# Altium footprint library Capacitor.PcbLib: 59 footprints (part 3 of 4)
Each footprint in its own frame and in the unit in brackets; x right, y up, seen from the top. Pads: shape width x height; smd on the part's side, far side on the other; paste and mask are expansions set on the pad; w line width, h text height; cw(c..) or ccw(c..) is an arc to the next point about the centre after c.
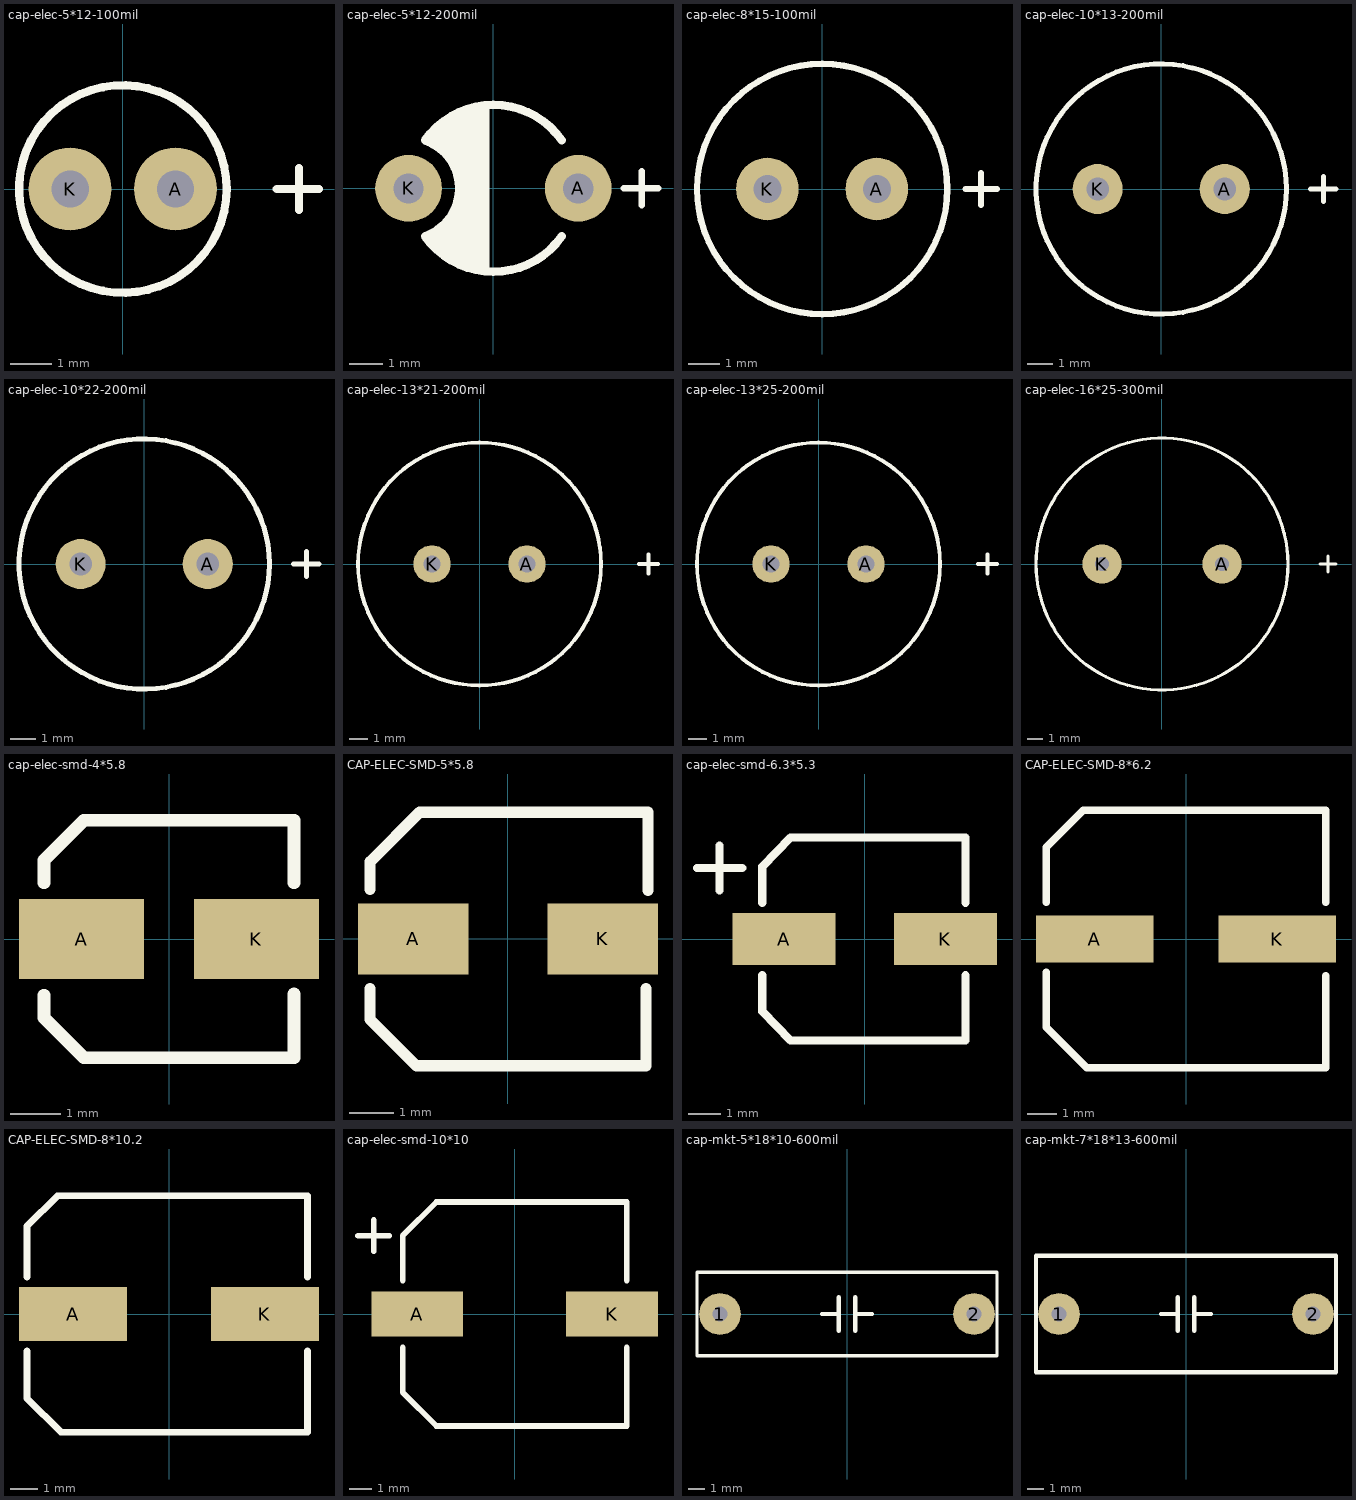
[diagram p2: the footprints below, top view; thin cyan lines are the x and y axes]

## cap-elec-5*12-100mil [mm] "Radial Electrolytic Capacitor - Dimenssion 5*12 (D,H) - 100mil Pitch"
height 12
pads (2):
  round 2 hole 0.9: A(1.27,0) K(-1.27,0)
Top Overlay:
  circle w0.2: c0,0 r2.5
  lines w0.2: 3.708,0 4.724,0 ; 4.242,-0.508 4.242,0.508
3D body "User Library-CE_R100_D200_H460.step": height 13.7, standoff -1.4, extent -2.54,-2.54 2.54,2.54

## cap-elec-5*12-200mil [mm] "Radial Electrolytic Capacitor - Dimenssion 5*12 (D,H) - 200mil Pitch"
height 12
pads (2):
  round 2 hole 0.9: A(2.54,0) K(-2.54,0)
Top Overlay:
  region: -0.127,2.413 -0.127,-2.54 -1.143,-2.286 -2.048,-1.434 -1.27,-0.889 -1.016,0 -1.397,1.016 -2.048,1.434 -1.016,2.286
  lines w0.2: 3.912,0 4.928,0 ; 4.445,-0.508 4.445,0.508
  lines w0.254: 2.048,-1.434 cw(c0,0) -2.048,-1.434 ccw(c-2.54,0) -2.048,1.434 cw(c0,0) 2.048,1.434
3D body "User Library-CE_R200_D200_H460.step": height 14.7, standoff -1.9, extent -2.79,-2.54 2.79,2.54

## cap-elec-8*15-100mil [mm] "Radial Electrolytic Capacitor - Dimenssion 8*15 (D,H) - 100mil Pitch"
height 15
pads (2):
  round 2 hole 0.9: A(1.75,0) K(-1.75,0)
Top Overlay:
  circle w0.2: c0,0 r4
  lines w0.2: 4.588,0 5.588,0 ; 5.08,-0.508 5.08,0.508
3D body "User Library-CE_R150_D320_H570.step": height 14.4, standoff -2.9, extent -4.1,-4.1 4.1,4.1

## cap-elec-10*13-200mil [mm] "Radial Electrolytic Capacitor - Dimenssion 10*13 (D,H) - 200mil Pitch"
height 13
pads (2):
  round 2 hole 0.9: A(2.54,0) K(-2.54,0)
Top Overlay:
  circle w0.2: c0,0 r5
  lines w0.2: 5.969,0 6.985,0 ; 6.477,-0.508 6.477,0.508
3D body "User Library-CE_R200_D400_H500.STEP": height 13.3, standoff -2.1, extent -5.08,-5.08 5.08,5.08

## cap-elec-10*22-200mil [mm] "Radial Electrolytic Capacitor - Dimenssion 10*22 (D,H) - 200mil Pitch"
height 22
pads (2):
  round 2 hole 0.9: A(2.54,0) K(-2.54,0)
Top Overlay:
  circle w0.2: c0,0 r5
  lines w0.2: 5.969,0 6.985,0 ; 6.477,-0.508 6.477,0.508
3D body "User Library-CE_R200_D400_H800.step": height 20.32, standoff -2.9, extent -5.08,-5.08 5.08,5.08

## cap-elec-13*21-200mil [mm] "Radial Electrolytic Capacitor - Dimenssion 13*21 (D,H) - 200mil Pitch"
height 21
pads (2):
  round 2 hole 0.9: A(2.54,0) K(-2.54,0)
Top Overlay:
  circle w0.2: c0,0 r6.5
  lines w0.2: 8.532,0 9.548,0 ; 9.04,-0.508 9.04,0.508
3D body "User Library-CapAluRadial_D125H200.STEP": height 22, standoff -3, extent -6.444,-6.48 6.5,6.48

## cap-elec-13*25-200mil [mm] "Radial Electrolytic Capacitor - Dimenssion 13*25 (D,H) - 200mil Pitch"
height 25
pads (2):
  round 2 hole 0.9: A(2.54,0) K(-2.54,0)
Top Overlay:
  circle w0.2: c0,0 r6.5
  lines w0.2: 8.532,0 9.548,0 ; 9.04,-0.508 9.04,0.508
3D body "User Library-Cap-EL(13x25-5).step": height 25, standoff -3.3, extent -6.502,-6.499 6.5,6.499

## cap-elec-16*25-300mil [mm] "Radial Electrolytic Capacitor - Dimenssion 16*25 (D,H) - 300mil Pitch"
height 25
pads (2):
  round 2.5 hole 0.9: A(3.81,0) K(-3.81,0)
Top Overlay:
  circle w0.2: c0,0 r8
  lines w0.2: 10.032,0 11.048,0 ; 10.54,-0.508 10.54,0.508
3D body "User Library-CE_R300_D650_H1000.STEP": height 26.4, standoff -2.5, extent -8.199,-8.281 8.284,8.18

## cap-elec-smd-4*5.8 [mm]
height 5.8
pads (2):
  rect 2.5x1.6 smd: A(-1.75,0) K(1.75,0)
Top Overlay:
  lines w0.254: -2.5,-1.125 -2.5,-1.575 -1.7,-2.375 2.475,-2.375 2.5,-2.375 2.5,-1.1 ; -2.5,1.125 -2.5,1.575 -1.7,2.375 2.5,2.375 2.5,1.125
3D body "User Library-ALU-B.STEP": height 5.4, standoff 0, extent -2.3,-2.15 2.3,2.15

## CAP-ELEC-SMD-5*5.8 [mm]
height 5.8
pads (2):
  rect 2.5x1.6 smd: A(-2.15,0) K(2.15,0)
Top Overlay:
  lines w0.254: -3.125,-1.125 -3.125,-1.825 -2.075,-2.875 3.125,-2.875 3.125,-1.125 ; -3.125,1.125 -3.125,1.75 -2,2.875 0,2.875 3.175,2.875 3.175,1.1
3D body "User Library-ALU-C.STEP": height 5.41, standoff 0, extent -2.95,-2.65 2.95,2.65

## cap-elec-smd-6.3*5.3 [mm]
height 5.3
pads (2):
  rect 3.2x1.6 smd: A(-2.5,0) K(2.5,0)
Top Overlay:
  lines w0.254: -5.2,2.2 -3.8,2.2 ; -4.5,1.5 -4.5,2.9 ; -3.175,-1.125 -3.175,-2.25 -2.3,-3.15 3.125,-3.15 3.125,-1.125 ; -3.175,1.125 -3.175,2.25 -2.3,3.15 3.125,3.15 3.125,1.125
3D body "User Library-CAP SMD SVP 6_3x5_9.STEP": height 5.9, standoff 0, extent -3.65,-3.3 3.65,3.3

## CAP-ELEC-SMD-8*6.2 [mm]
height 6.2
pads (2):
  rect 4x1.6 smd: A(-3.1,0) K(3.1,0)
Top Overlay:
  lines w0.254: -4.75,-1.125 -4.75,-3 -3.375,-4.375 4.75,-4.375 4.75,-1.25 ; -4.75,1.25 -4.75,3.125 -3.5,4.375 4.75,4.375 4.75,1.25
3D body "User Library-ALU-E.STEP": height 6.2, standoff 0, extent -4.5,-4.15 4.5,4.15

## CAP-ELEC-SMD-8*10.2 [mm]
height 10.2
pads (2):
  rect 4x2 smd: A(-3.55,0) K(3.55,0)
Top Overlay:
  lines w0.254: -5.25,-1.375 -5.25,-3.125 -4,-4.375 5.125,-4.375 5.125,-1.375 ; -5.25,1.375 -5.25,3.25 -4.125,4.375 5.125,4.375 5.125,1.375
3D body "User Library-ALU-F.STEP": height 10.2, standoff 0, extent -4.95,-4.15 4.95,4.15

## cap-elec-smd-10*10 [mm]
height 10
pads (2):
  rect 4.1x2 smd: A(-4.35,0) K(4.35,0)
Top Overlay:
  lines w0.254: -7,3.5 -5.6,3.5 ; -6.3,2.8 -6.3,4.2 ; -5,-1.5 -5,-3.5 -3.5,-5 5,-5 5,-1.5 ; -5,1.5 -5,3.5 -3.5,5 5,5 5,1.5
3D body "User Library-cap_10x10x10-1.STEP": height 10.55, standoff 0.05, extent -5.901,-5.25 5.899,5.25

## cap-mkt-5*18*10-600mil [mm] "MKT Capacitor - Dimenssion 5*18*10 (W,L,H) - 600mil Pitch"
height 10
pads (2):
  round 2.5 hole 0.9: 1(-7.62,0) 2(7.62,0)
Top Overlay:
  lines w0.2: -9,-2.5 9,-2.5 9,2.5 -9,2.5 -9,-2.5
  lines w0.254: -1.5,0 -0.5,0 ; -0.5,-1 -0.5,1 ; 0.5,-1 0.5,1 ; 0.5,0 1.5,0

## cap-mkt-7*18*13-600mil [mm] "MKT Capacitor - Dimenssion 4*18*13 (W,L,H) - 600mil Pitch"
height 13
pads (2):
  round 2.5 hole 0.9: 1(-7.62,0) 2(7.62,0)
Top Overlay:
  lines w0.254: -1.5,0 -0.5,0 ; -0.5,-1 -0.5,1 ; 0.5,-1 0.5,1 ; 0.5,0 1.5,0 ; -9,-3.5 9,-3.5 9,3.5 -9,3.5 -9,-3.5